# Altium footprint library MH_DA_THU_VIEN_16122016.PcbLib: 531 footprints (part 16 of 34)
Each footprint in its own frame and in the unit in brackets; x right, y up, seen from the top. Pads: shape width x height; smd on the part's side, far side on the other; paste and mask are expansions set on the pad; w line width, h text height; cw(c..) or ccw(c..) is an arc to the next point about the centre after c.
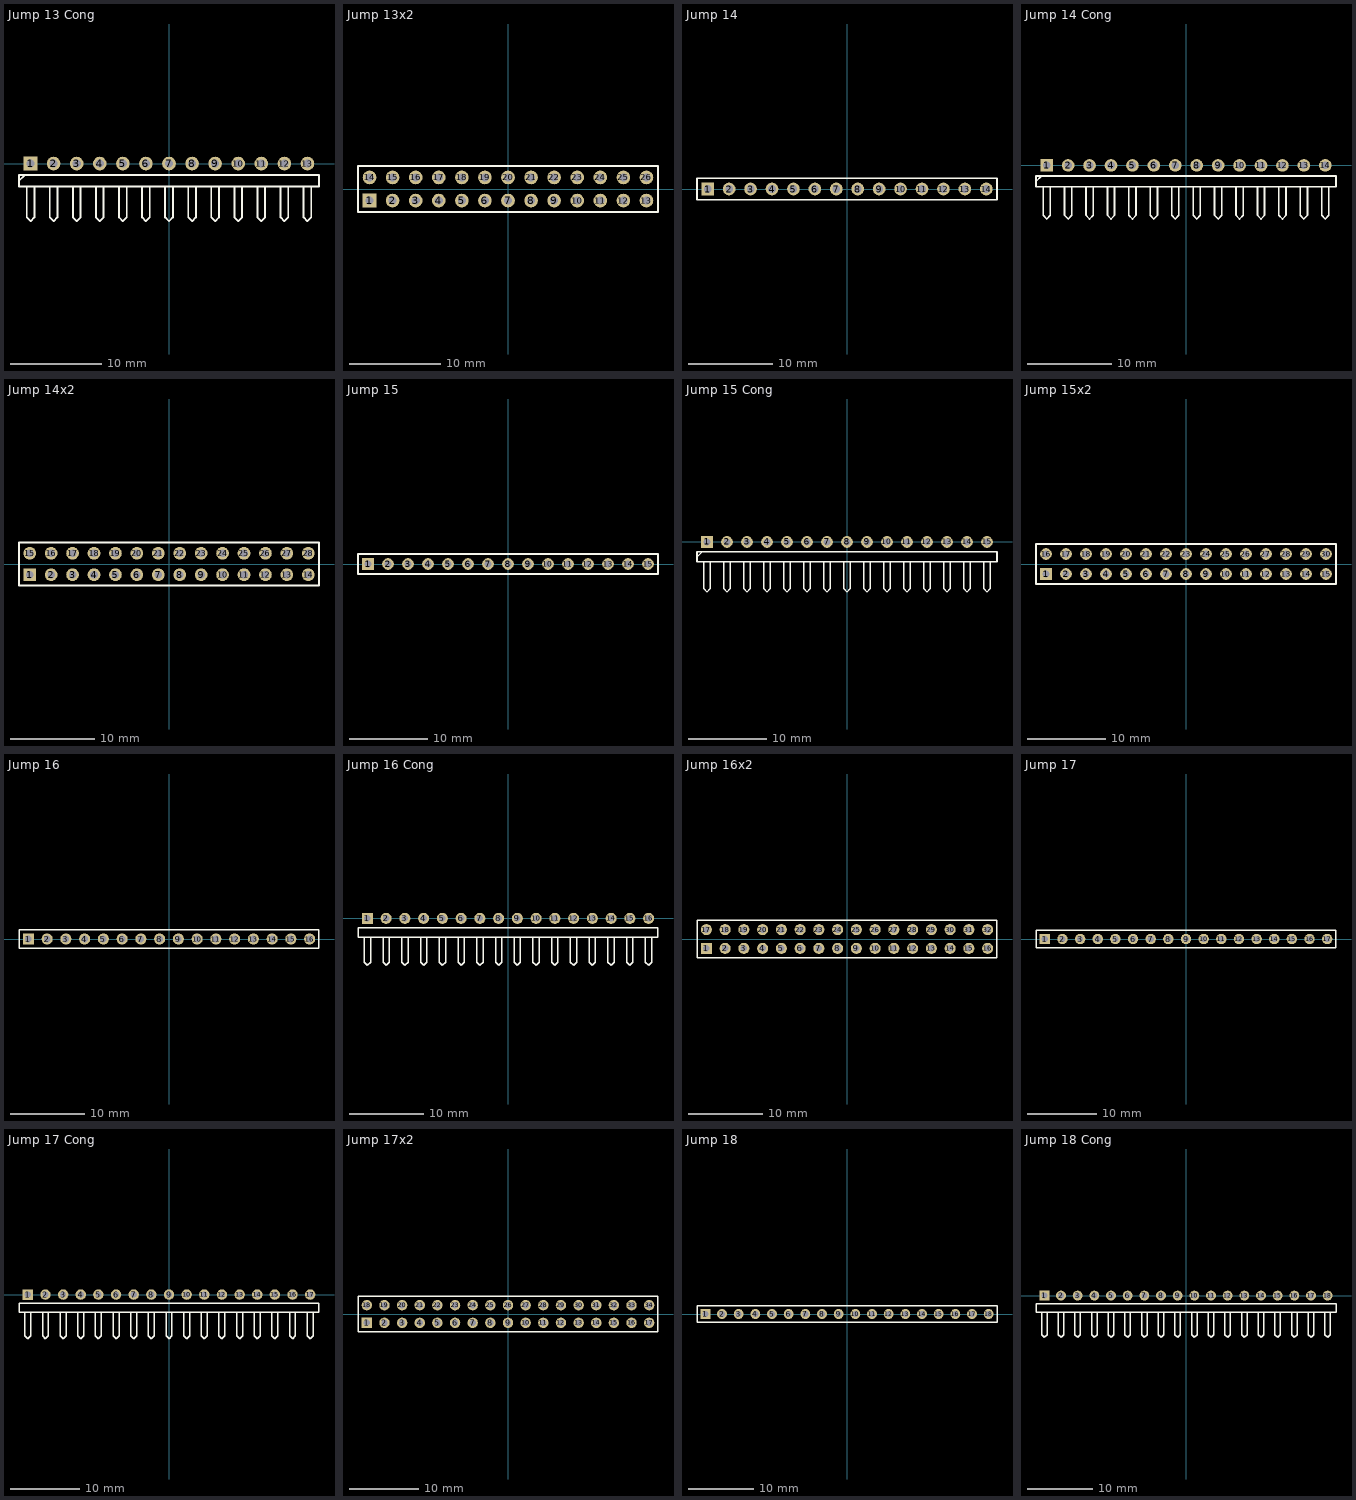
[diagram p15: the footprints below, top view; thin cyan lines are the x and y axes]

## Jump 13 Cong [mm]
pads (13):
  rect 1.5x1.5 hole 0.9: 1(-15.24,0)
  round 1.5 hole 0.9: 2(-12.7,0) 3(-10.16,0) 4(-7.62,0) 5(-5.08,0) 6(-2.54,0) 7(0,0) 8(2.54,0) 9(5.08,0) 10(7.62,0) 11(10.16,0) 12(12.7,0) 13(15.24,0)
Top Overlay:
  lines w0.2: -16.51,-1.905 -15.875,-1.27 ; -15.663,-2.54 -15.663,-5.927 -15.24,-6.35 -14.817,-5.927 -14.817,-2.54 ; -13.123,-2.54 -13.123,-5.927 -12.7,-6.35 -12.277,-5.927 -12.277,-2.54 ; -10.583,-2.54 -10.583,-5.927 -10.16,-6.35 -9.737,-5.927 -9.737,-2.54 ; -8.043,-2.54 -8.043,-5.927 -7.62,-6.35 -7.197,-5.927 -7.197,-2.54 ; -5.503,-2.54 -5.503,-5.927 -5.08,-6.35 -4.657,-5.927 -4.657,-2.54 ; -2.963,-2.54 -2.963,-5.927 -2.54,-6.35 -2.117,-5.927 -2.117,-2.54 ; -0.423,-2.54 -0.423,-5.927 0,-6.35 0.423,-5.927 0.423,-2.54 ; 2.117,-2.54 2.117,-5.927 2.54,-6.35 2.963,-5.927 2.963,-2.54 ; 4.657,-2.54 4.657,-5.927 5.08,-6.35 5.503,-5.927 5.503,-2.54 ; 7.197,-2.54 7.197,-5.927 7.62,-6.35 8.043,-5.927 8.043,-2.54 ; 9.737,-2.54 9.737,-5.927 10.16,-6.35 10.583,-5.927 10.583,-2.54 ; 12.277,-2.54 12.277,-5.927 12.7,-6.35 13.123,-5.927 13.123,-2.54 ; 14.817,-2.54 14.817,-5.927 15.24,-6.35 15.663,-5.927 15.663,-2.54 ; -16.51,-2.54 16.51,-2.54 16.51,-1.27 -14.605,-1.27 -16.51,-1.27 -16.51,-2.54
3D body: height 4.33, standoff -3, extent -16.51,-7 -11.43,1.27
3D body: height 4.33, standoff -3, extent -11.43,-7 -6.35,1.27
3D body: height 4.33, standoff -3, extent -6.35,-7 -1.27,1.27
3D body: height 4.33, standoff -3, extent -1.27,-7 3.81,1.27
3D body: height 4.33, standoff -3, extent 3.81,-7 8.89,1.27
3D body: height 4.33, standoff -3, extent 8.89,-7 16.51,1.27

## Jump 13x2 [mm]
pads (26):
  rect 1.5x1.5 hole 0.9: 1(-15.24,-1.27)
  round 1.5 hole 0.9: 2(-12.7,-1.27) 3(-10.16,-1.27) 4(-7.62,-1.27) 5(-5.08,-1.27) 6(-2.54,-1.27) 7(0,-1.27) 8(2.54,-1.27) 9(5.08,-1.27) 10(7.62,-1.27) 11(10.16,-1.27) 12(12.7,-1.27) 13(15.24,-1.27) 14(-15.24,1.27) 15(-12.7,1.27) 16(-10.16,1.27) 17(-7.62,1.27) 18(-5.08,1.27) 19(-2.54,1.27) 20(0,1.27) 21(2.54,1.27) 22(5.08,1.27) 23(7.62,1.27) 24(10.16,1.27) 25(12.7,1.27) 26(15.24,1.27)
Top Overlay:
  lines w0.2: -16.51,-2.54 -16.51,2.54 16.51,2.54 16.51,-2.54 -16.51,-2.54
3D body: height 1.5, standoff 0, extent -16.51,-2.54 -13.97,0
3D body: height 1.5, standoff 0, extent -16.51,0 -13.97,2.54
3D body: height 1.5, standoff 0, extent -13.97,-2.54 -11.43,0
3D body: height 1.5, standoff 0, extent -13.97,0 -11.43,2.54
3D body: height 1.5, standoff 0, extent -11.43,-2.54 -8.89,0
3D body: height 1.5, standoff 0, extent -11.43,0 -8.89,2.54
3D body: height 1.5, standoff 0, extent -8.89,-2.54 -6.35,0
3D body: height 1.5, standoff 0, extent -8.89,0 -6.35,2.54
3D body: height 1.5, standoff 0, extent -6.35,-2.54 -3.81,0
3D body: height 1.5, standoff 0, extent -6.35,0 -3.81,2.54
3D body: height 1.5, standoff 0, extent -3.81,-2.54 -1.27,0
3D body: height 1.5, standoff 0, extent -3.81,0 -1.27,2.54
3D body: height 1.5, standoff 0, extent -1.27,-2.54 1.27,0
3D body: height 1.5, standoff 0, extent -1.27,0 1.27,2.54
3D body: height 1.5, standoff 0, extent 1.27,-2.54 3.81,0
3D body: height 1.5, standoff 0, extent 1.27,0 3.81,2.54
3D body: height 1.5, standoff 0, extent 3.81,-2.54 6.35,0
3D body: height 1.5, standoff 0, extent 3.81,0 6.35,2.54
3D body: height 1.5, standoff 0, extent 6.35,-2.54 8.89,0
3D body: height 1.5, standoff 0, extent 6.35,0 8.89,2.54
3D body: height 1.5, standoff 0, extent 8.89,-2.54 11.43,0
3D body: height 1.5, standoff 0, extent 8.89,0 11.43,2.54
3D body: height 1.5, standoff 0, extent 13.97,0 16.51,2.54
3D body: height 1.5, standoff 0, extent 13.97,-2.54 16.51,0
3D body: height 1.5, standoff 0, extent 11.43,0 13.97,2.54
3D body: height 1.5, standoff 0, extent 11.43,-2.54 13.97,0

## Jump 14 [mm]
pads (14):
  rect 1.5x1.5 hole 0.9: 1(-16.51,0)
  round 1.5 hole 0.9: 2(-13.97,0) 3(-11.43,0) 4(-8.89,0) 5(-6.35,0) 6(-3.81,0) 7(-1.27,0) 8(1.27,0) 9(3.81,0) 10(6.35,0) 11(8.89,0) 12(11.43,0) 13(13.97,0) 14(16.51,0)
Top Overlay:
  lines w0.2: -17.78,-1.27 17.78,-1.27 17.78,1.27 -15.875,1.27 -17.78,1.27 -17.78,-1.27
3D body: height 1.5, standoff 0, extent -7.62,-1.27 -5.08,1.27
3D body: height 7, standoff -1, extent -6.756,-0.406 -5.96,0.392
3D body: height 1.5, standoff 0, extent -10.16,-1.27 -7.62,1.27
3D body: height 7, standoff -1, extent -9.296,-0.406 -8.5,0.392
3D body: height 1.5, standoff 0, extent -12.7,-1.27 -10.16,1.27
3D body: height 7, standoff -1, extent -11.836,-0.406 -11.04,0.392
3D body: height 1.5, standoff 0, extent -15.24,-1.27 -12.7,1.27
3D body: height 7, standoff -1, extent -14.376,-0.406 -13.58,0.392
3D body: height 1.5, standoff 0, extent -17.78,-1.27 -15.24,1.27
3D body: height 7, standoff -1, extent -16.916,-0.406 -16.12,0.392
3D body: height 1.5, standoff 0, extent 5.08,-1.27 7.62,1.27
3D body: height 7, standoff -1, extent 5.944,-0.406 6.74,0.392
3D body: height 1.5, standoff 0, extent 2.54,-1.27 5.08,1.27
3D body: height 7, standoff -1, extent 3.404,-0.406 4.2,0.392
3D body: height 1.5, standoff 0, extent 0,-1.27 2.54,1.27
3D body: height 7, standoff -1, extent 0.864,-0.406 1.66,0.392
3D body: height 1.5, standoff 0, extent -2.54,-1.27 0,1.27
3D body: height 7, standoff -1, extent -1.676,-0.406 -0.88,0.392
3D body: height 1.5, standoff 0, extent -5.08,-1.27 -2.54,1.27
3D body: height 7, standoff -1, extent -4.216,-0.406 -3.42,0.392
3D body: height 1.5, standoff 0, extent 15.24,-1.27 17.78,1.27
3D body: height 7, standoff -1, extent 16.104,-0.406 16.9,0.392
3D body: height 1.5, standoff 0, extent 12.7,-1.27 15.24,1.27
3D body: height 7, standoff -1, extent 13.564,-0.406 14.36,0.392
3D body: height 1.5, standoff 0, extent 10.16,-1.27 12.7,1.27
3D body: height 7, standoff -1, extent 11.024,-0.406 11.82,0.392
3D body: height 1.5, standoff 0, extent 7.62,-1.27 10.16,1.27
3D body: height 7, standoff -1, extent 8.484,-0.406 9.28,0.392

## Jump 14 Cong [mm]
pads (14):
  rect 1.5x1.5 hole 0.9: 1(-16.51,0)
  round 1.5 hole 0.9: 2(-13.97,0) 3(-11.43,0) 4(-8.89,0) 5(-6.35,0) 6(-3.81,0) 7(-1.27,0) 8(1.27,0) 9(3.81,0) 10(6.35,0) 11(8.89,0) 12(11.43,0) 13(13.97,0) 14(16.51,0)
Top Overlay:
  lines w0.2: -17.78,-1.905 -17.145,-1.27 ; -16.933,-2.54 -16.933,-5.927 -16.51,-6.35 -16.087,-5.927 -16.087,-2.54 ; -14.393,-2.54 -14.393,-5.927 -13.97,-6.35 -13.547,-5.927 -13.547,-2.54 ; -11.853,-2.54 -11.853,-5.927 -11.43,-6.35 -11.007,-5.927 -11.007,-2.54 ; -9.313,-2.54 -9.313,-5.927 -8.89,-6.35 -8.467,-5.927 -8.467,-2.54 ; -6.773,-2.54 -6.773,-5.927 -6.35,-6.35 -5.927,-5.927 -5.927,-2.54 ; -4.233,-2.54 -4.233,-5.927 -3.81,-6.35 -3.387,-5.927 -3.387,-2.54 ; -1.693,-2.54 -1.693,-5.927 -1.27,-6.35 -0.847,-5.927 -0.847,-2.54 ; 0.847,-2.54 0.847,-5.927 1.27,-6.35 1.693,-5.927 1.693,-2.54 ; 3.387,-2.54 3.387,-5.927 3.81,-6.35 4.233,-5.927 4.233,-2.54 ; 5.927,-2.54 5.927,-5.927 6.35,-6.35 6.773,-5.927 6.773,-2.54 ; 8.467,-2.54 8.467,-5.927 8.89,-6.35 9.313,-5.927 9.313,-2.54 ; 11.007,-2.54 11.007,-5.927 11.43,-6.35 11.853,-5.927 11.853,-2.54 ; 13.547,-2.54 13.547,-5.927 13.97,-6.35 14.393,-5.927 14.393,-2.54 ; 16.087,-2.54 16.087,-5.927 16.51,-6.35 16.933,-5.927 16.933,-2.54 ; -17.78,-2.54 -17.78,-1.27 -15.875,-1.27 17.78,-1.27 17.78,-2.54 -17.78,-2.54
3D body: height 4.33, standoff -3, extent 12.7,-7 17.78,1.27
3D body: height 4.33, standoff -3, extent 7.62,-7 12.7,1.27
3D body: height 4.33, standoff -3, extent 2.54,-7 7.62,1.27
3D body: height 4.33, standoff -3, extent -2.54,-7 2.54,1.27
3D body: height 4.33, standoff -3, extent -7.62,-7 -2.54,1.27
3D body: height 4.33, standoff -3, extent -12.7,-7 -7.62,1.27
3D body: height 4.33, standoff -3, extent -17.78,-7 -12.7,1.27

## Jump 14x2 [mm]
pads (28):
  rect 1.5x1.5 hole 0.9: 1(-16.51,-1.27)
  round 1.5 hole 0.9: 2(-13.97,-1.27) 3(-11.43,-1.27) 4(-8.89,-1.27) 5(-6.35,-1.27) 6(-3.81,-1.27) 7(-1.27,-1.27) 8(1.27,-1.27) 9(3.81,-1.27) 10(6.35,-1.27) 11(8.89,-1.27) 12(11.43,-1.27) 13(13.97,-1.27) 14(16.51,-1.27) 15(-16.51,1.27) 16(-13.97,1.27) 17(-11.43,1.27) 18(-8.89,1.27) 19(-6.35,1.27) 20(-3.81,1.27) 21(-1.27,1.27) 22(1.27,1.27) 23(3.81,1.27) 24(6.35,1.27) 25(8.89,1.27) 26(11.43,1.27) 27(13.97,1.27) 28(16.51,1.27)
Top Overlay:
  lines w0.2: -17.78,-2.54 17.78,-2.54 17.78,2.54 -17.78,2.54 -17.78,-2.54
3D body: height 1.5, standoff 0, extent 15.24,-2.54 17.78,0
3D body: height 1.5, standoff 0, extent 15.24,0 17.78,2.54
3D body: height 1.5, standoff 0, extent 10.16,-2.54 12.7,0
3D body: height 1.5, standoff 0, extent 10.16,0 12.7,2.54
3D body: height 1.5, standoff 0, extent 12.7,-2.54 15.24,0
3D body: height 1.5, standoff 0, extent 12.7,0 15.24,2.54
3D body: height 1.5, standoff 0, extent 7.62,0 10.16,2.54
3D body: height 1.5, standoff 0, extent 7.62,-2.54 10.16,0
3D body: height 1.5, standoff 0, extent 5.08,0 7.62,2.54
3D body: height 1.5, standoff 0, extent 5.08,-2.54 7.62,0
3D body: height 1.5, standoff 0, extent 2.54,0 5.08,2.54
3D body: height 1.5, standoff 0, extent 2.54,-2.54 5.08,0
3D body: height 1.5, standoff 0, extent 0,0 2.54,2.54
3D body: height 1.5, standoff 0, extent 0,-2.54 2.54,0
3D body: height 1.5, standoff 0, extent -2.54,0 0,2.54
3D body: height 1.5, standoff 0, extent -2.54,-2.54 0,0
3D body: height 1.5, standoff 0, extent -5.08,0 -2.54,2.54
3D body: height 1.5, standoff 0, extent -5.08,-2.54 -2.54,0
3D body: height 1.5, standoff 0, extent -7.62,0 -5.08,2.54
3D body: height 1.5, standoff 0, extent -7.62,-2.54 -5.08,0
3D body: height 1.5, standoff 0, extent -10.16,0 -7.62,2.54
3D body: height 1.5, standoff 0, extent -10.16,-2.54 -7.62,0
3D body: height 1.5, standoff 0, extent -12.7,0 -10.16,2.54
3D body: height 1.5, standoff 0, extent -12.7,-2.54 -10.16,0
3D body: height 1.5, standoff 0, extent -15.24,0 -12.7,2.54
3D body: height 1.5, standoff 0, extent -15.24,-2.54 -12.7,0
3D body: height 1.5, standoff 0, extent -17.78,0 -15.24,2.54
3D body: height 1.5, standoff 0, extent -17.78,-2.54 -15.24,0

## Jump 15 [mm]
pads (15):
  rect 1.5x1.5 hole 0.9: 1(-17.78,0)
  round 1.5 hole 0.9: 2(-15.24,0) 3(-12.7,0) 4(-10.16,0) 5(-7.62,0) 6(-5.08,0) 7(-2.54,0) 8(0,0) 9(2.54,0) 10(5.08,0) 11(7.62,0) 12(10.16,0) 13(12.7,0) 14(15.24,0) 15(17.78,0)
Top Overlay:
  lines w0.2: -19.05,-1.27 19.05,-1.27 19.05,1.27 -17.145,1.27 -19.05,1.27 -19.05,-1.27
3D body: height 7, standoff -1, extent 7.214,-0.406 8.01,0.392
3D body: height 1.5, standoff 0, extent 6.35,-1.27 8.89,1.27
3D body: height 7, standoff -1, extent 9.754,-0.406 10.55,0.392
3D body: height 1.5, standoff 0, extent 8.89,-1.27 11.43,1.27
3D body: height 7, standoff -1, extent 12.294,-0.406 13.09,0.392
3D body: height 1.5, standoff 0, extent 11.43,-1.27 13.97,1.27
3D body: height 7, standoff -1, extent 14.834,-0.406 15.63,0.392
3D body: height 1.5, standoff 0, extent 13.97,-1.27 16.51,1.27
3D body: height 7, standoff -1, extent 17.374,-0.406 18.17,0.392
3D body: height 1.5, standoff 0, extent 16.51,-1.27 19.05,1.27
3D body: height 7, standoff -1, extent -5.486,-0.406 -4.69,0.392
3D body: height 1.5, standoff 0, extent -6.35,-1.27 -3.81,1.27
3D body: height 7, standoff -1, extent -2.946,-0.406 -2.15,0.392
3D body: height 1.5, standoff 0, extent -3.81,-1.27 -1.27,1.27
3D body: height 7, standoff -1, extent -0.406,-0.406 0.39,0.392
3D body: height 1.5, standoff 0, extent -1.27,-1.27 1.27,1.27
3D body: height 7, standoff -1, extent 2.134,-0.406 2.93,0.392
3D body: height 1.5, standoff 0, extent 1.27,-1.27 3.81,1.27
3D body: height 7, standoff -1, extent 4.674,-0.406 5.47,0.392
3D body: height 1.5, standoff 0, extent 3.81,-1.27 6.35,1.27
3D body: height 7, standoff -1, extent -18.186,-0.406 -17.39,0.392
3D body: height 1.5, standoff 0, extent -19.05,-1.27 -16.51,1.27
3D body: height 7, standoff -1, extent -15.646,-0.406 -14.85,0.392
3D body: height 1.5, standoff 0, extent -16.51,-1.27 -13.97,1.27
3D body: height 7, standoff -1, extent -13.106,-0.406 -12.31,0.392
3D body: height 1.5, standoff 0, extent -13.97,-1.27 -11.43,1.27
3D body: height 7, standoff -1, extent -10.566,-0.406 -9.77,0.392
3D body: height 1.5, standoff 0, extent -11.43,-1.27 -8.89,1.27
3D body: height 7, standoff -1, extent -8.026,-0.406 -7.23,0.392
3D body: height 1.5, standoff 0, extent -8.89,-1.27 -6.35,1.27

## Jump 15 Cong [mm]
pads (15):
  rect 1.5x1.5 hole 0.9: 1(-17.78,0)
  round 1.5 hole 0.9: 2(-15.24,0) 3(-12.7,0) 4(-10.16,0) 5(-7.62,0) 6(-5.08,0) 7(-2.54,0) 8(0,0) 9(2.54,0) 10(5.08,0) 11(7.62,0) 12(10.16,0) 13(12.7,0) 14(15.24,0) 15(17.78,0)
Top Overlay:
  lines w0.2: -19.05,-1.905 -18.415,-1.27 ; -18.203,-2.54 -18.203,-5.927 -17.78,-6.35 -17.357,-5.927 -17.357,-2.54 ; -15.663,-2.54 -15.663,-5.927 -15.24,-6.35 -14.817,-5.927 -14.817,-2.54 ; -13.123,-2.54 -13.123,-5.927 -12.7,-6.35 -12.277,-5.927 -12.277,-2.54 ; -10.583,-2.54 -10.583,-5.927 -10.16,-6.35 -9.737,-5.927 -9.737,-2.54 ; -8.043,-2.54 -8.043,-5.927 -7.62,-6.35 -7.197,-5.927 -7.197,-2.54 ; -5.503,-2.54 -5.503,-5.927 -5.08,-6.35 -4.657,-5.927 -4.657,-2.54 ; -2.963,-2.54 -2.963,-5.927 -2.54,-6.35 -2.117,-5.927 -2.117,-2.54 ; -0.423,-2.54 -0.423,-5.927 0,-6.35 0.423,-5.927 0.423,-2.54 ; 2.117,-2.54 2.117,-5.927 2.54,-6.35 2.963,-5.927 2.963,-2.54 ; 4.657,-2.54 4.657,-5.927 5.08,-6.35 5.503,-5.927 5.503,-2.54 ; 7.197,-2.54 7.197,-5.927 7.62,-6.35 8.043,-5.927 8.043,-2.54 ; 9.737,-2.54 9.737,-5.927 10.16,-6.35 10.583,-5.927 10.583,-2.54 ; 12.277,-2.54 12.277,-5.927 12.7,-6.35 13.123,-5.927 13.123,-2.54 ; 14.817,-2.54 14.817,-5.927 15.24,-6.35 15.663,-5.927 15.663,-2.54 ; 17.357,-2.54 17.357,-5.927 17.78,-6.35 18.203,-5.927 18.203,-2.54 ; -19.05,-2.54 -19.05,-1.27 -17.145,-1.27 19.05,-1.27 19.05,-2.54 -19.05,-2.54
3D body: height 4.33, standoff -3, extent 1.27,-7 6.35,1.27
3D body: height 4.33, standoff -3, extent -3.81,-7 1.27,1.27
3D body: height 4.33, standoff -3, extent -8.89,-7 -3.81,1.27
3D body: height 4.33, standoff -3, extent -13.97,-7 -8.89,1.27
3D body: height 4.33, standoff -3, extent -19.05,-7 -13.97,1.27
3D body: height 4.33, standoff -3, extent 6.35,-7 13.97,1.27
3D body: height 4.33, standoff -3, extent 13.97,-7 19.05,1.27

## Jump 15x2 [mm]
pads (30):
  rect 1.5x1.5 hole 0.9: 1(-17.78,-1.27)
  round 1.5 hole 0.9: 2(-15.24,-1.27) 3(-12.7,-1.27) 4(-10.16,-1.27) 5(-7.62,-1.27) 6(-5.08,-1.27) 7(-2.54,-1.27) 8(0,-1.27) 9(2.54,-1.27) 10(5.08,-1.27) 11(7.62,-1.27) 12(10.16,-1.27) 13(12.7,-1.27) 14(15.24,-1.27) 15(17.78,-1.27) 16(-17.78,1.27) 17(-15.24,1.27) 18(-12.7,1.27) 19(-10.16,1.27) 20(-7.62,1.27) 21(-5.08,1.27) 22(-2.54,1.27) 23(0,1.27) 24(2.54,1.27) 25(5.08,1.27) 26(7.62,1.27) 27(10.16,1.27) 28(12.7,1.27) 29(15.24,1.27) 30(17.78,1.27)
Top Overlay:
  lines w0.2: -19.05,-2.54 19.05,-2.54 19.05,2.54 -19.05,2.54 -19.05,-2.54
3D body: height 1.5, standoff 0, extent -19.05,-2.54 -16.51,0
3D body: height 1.5, standoff 0, extent -19.05,0 -16.51,2.54
3D body: height 1.5, standoff 0, extent -16.51,-2.54 -13.97,0
3D body: height 1.5, standoff 0, extent -16.51,0 -13.97,2.54
3D body: height 1.5, standoff 0, extent -13.97,-2.54 -11.43,0
3D body: height 1.5, standoff 0, extent -13.97,0 -11.43,2.54
3D body: height 1.5, standoff 0, extent -11.43,-2.54 -8.89,0
3D body: height 1.5, standoff 0, extent -11.43,0 -8.89,2.54
3D body: height 1.5, standoff 0, extent -8.89,-2.54 -6.35,0
3D body: height 1.5, standoff 0, extent -8.89,0 -6.35,2.54
3D body: height 1.5, standoff 0, extent -6.35,-2.54 -3.81,0
3D body: height 1.5, standoff 0, extent -6.35,0 -3.81,2.54
3D body: height 1.5, standoff 0, extent -3.81,-2.54 -1.27,0
3D body: height 1.5, standoff 0, extent -3.81,0 -1.27,2.54
3D body: height 1.5, standoff 0, extent -1.27,-2.54 1.27,0
3D body: height 1.5, standoff 0, extent -1.27,0 1.27,2.54
3D body: height 1.5, standoff 0, extent 1.27,-2.54 3.81,0
3D body: height 1.5, standoff 0, extent 1.27,0 3.81,2.54
3D body: height 1.5, standoff 0, extent 3.81,-2.54 6.35,0
3D body: height 1.5, standoff 0, extent 3.81,0 6.35,2.54
3D body: height 1.5, standoff 0, extent 6.35,-2.54 8.89,0
3D body: height 1.5, standoff 0, extent 6.35,0 8.89,2.54
3D body: height 1.5, standoff 0, extent 11.43,0 13.97,2.54
3D body: height 1.5, standoff 0, extent 11.43,-2.54 13.97,0
3D body: height 1.5, standoff 0, extent 8.89,0 11.43,2.54
3D body: height 1.5, standoff 0, extent 8.89,-2.54 11.43,0
3D body: height 1.5, standoff 0, extent 16.51,0 19.05,2.54
3D body: height 1.5, standoff 0, extent 16.51,-2.54 19.05,0
3D body: height 1.5, standoff 0, extent 13.97,0 16.51,2.54
3D body: height 1.5, standoff 0, extent 13.97,-2.54 16.51,0

## Jump 16 [mm]
pads (16):
  rect 1.5x1.5 hole 0.9: 1(-19.05,0)
  round 1.5 hole 0.9: 2(-16.51,0) 3(-13.97,0) 4(-11.43,0) 5(-8.89,0) 6(-6.35,0) 7(-3.81,0) 8(-1.27,0) 9(1.27,0) 10(3.81,0) 11(6.35,0) 12(8.89,0) 13(11.43,0) 14(13.97,0) 15(16.51,0) 16(19.05,0)
Top Overlay:
  lines w0.2: -20.32,-1.27 -20.32,1.27 -18.415,1.27 20.32,1.27 20.32,-1.27 -20.32,-1.27
3D body: height 1.5, standoff 0, extent -10.16,-1.27 -7.62,1.27
3D body: height 7, standoff -1, extent -9.296,-0.406 -8.5,0.392
3D body: height 1.5, standoff 0, extent -12.7,-1.27 -10.16,1.27
3D body: height 7, standoff -1, extent -11.836,-0.406 -11.04,0.392
3D body: height 1.5, standoff 0, extent -15.24,-1.27 -12.7,1.27
3D body: height 7, standoff -1, extent -14.376,-0.406 -13.58,0.392
3D body: height 1.5, standoff 0, extent -17.78,-1.27 -15.24,1.27
3D body: height 7, standoff -1, extent -16.916,-0.406 -16.12,0.392
3D body: height 1.5, standoff 0, extent -20.32,-1.27 -17.78,1.27
3D body: height 7, standoff -1, extent -19.456,-0.406 -18.66,0.392
3D body: height 1.5, standoff 0, extent 2.54,-1.27 5.08,1.27
3D body: height 7, standoff -1, extent 3.404,-0.406 4.2,0.392
3D body: height 1.5, standoff 0, extent 0,-1.27 2.54,1.27
3D body: height 7, standoff -1, extent 0.864,-0.406 1.66,0.392
3D body: height 1.5, standoff 0, extent -2.54,-1.27 0,1.27
3D body: height 7, standoff -1, extent -1.676,-0.406 -0.88,0.392
3D body: height 1.5, standoff 0, extent -5.08,-1.27 -2.54,1.27
3D body: height 7, standoff -1, extent -4.216,-0.406 -3.42,0.392
3D body: height 1.5, standoff 0, extent -7.62,-1.27 -5.08,1.27
3D body: height 7, standoff -1, extent -6.756,-0.406 -5.96,0.392
3D body: height 1.5, standoff 0, extent 15.24,-1.27 17.78,1.27
3D body: height 7, standoff -1, extent 16.104,-0.406 16.9,0.392
3D body: height 1.5, standoff 0, extent 12.7,-1.27 15.24,1.27
3D body: height 7, standoff -1, extent 13.564,-0.406 14.36,0.392
3D body: height 1.5, standoff 0, extent 10.16,-1.27 12.7,1.27
3D body: height 7, standoff -1, extent 11.024,-0.406 11.82,0.392
3D body: height 1.5, standoff 0, extent 7.62,-1.27 10.16,1.27
3D body: height 7, standoff -1, extent 8.484,-0.406 9.28,0.392
3D body: height 1.5, standoff 0, extent 5.08,-1.27 7.62,1.27
3D body: height 7, standoff -1, extent 5.944,-0.406 6.74,0.392
3D body: height 1.5, standoff 0, extent 17.78,-1.27 20.32,1.27
3D body: height 7, standoff -1, extent 18.644,-0.406 19.44,0.392

## Jump 16 Cong [mm]
pads (16):
  rect 1.5x1.5 hole 0.9: 1(-19.05,0)
  round 1.5 hole 0.9: 2(-16.51,0) 3(-13.97,0) 4(-11.43,0) 5(-8.89,0) 6(-6.35,0) 7(-3.81,0) 8(-1.27,0) 9(1.27,0) 10(3.81,0) 11(6.35,0) 12(8.89,0) 13(11.43,0) 14(13.97,0) 15(16.51,0) 16(19.05,0)
Top Overlay:
  lines w0.2: -19.473,-2.54 -19.473,-5.927 -19.05,-6.35 -18.627,-5.927 -18.627,-2.54 ; -16.933,-2.54 -16.933,-5.927 -16.51,-6.35 -16.087,-5.927 -16.087,-2.54 ; -14.393,-2.54 -14.393,-5.927 -13.97,-6.35 -13.547,-5.927 -13.547,-2.54 ; -11.853,-2.54 -11.853,-5.927 -11.43,-6.35 -11.007,-5.927 -11.007,-2.54 ; -9.313,-2.54 -9.313,-5.927 -8.89,-6.35 -8.467,-5.927 -8.467,-2.54 ; -6.773,-2.54 -6.773,-5.927 -6.35,-6.35 -5.927,-5.927 -5.927,-2.54 ; -4.233,-2.54 -4.233,-5.927 -3.81,-6.35 -3.387,-5.927 -3.387,-2.54 ; -1.693,-2.54 -1.693,-5.927 -1.27,-6.35 -0.847,-5.927 -0.847,-2.54 ; 0.847,-2.54 0.847,-5.927 1.27,-6.35 1.693,-5.927 1.693,-2.54 ; 3.387,-2.54 3.387,-5.927 3.81,-6.35 4.233,-5.927 4.233,-2.54 ; 5.927,-2.54 5.927,-5.927 6.35,-6.35 6.773,-5.927 6.773,-2.54 ; 8.467,-2.54 8.467,-5.927 8.89,-6.35 9.313,-5.927 9.313,-2.54 ; 11.007,-2.54 11.007,-5.927 11.43,-6.35 11.853,-5.927 11.853,-2.54 ; 13.547,-2.54 13.547,-5.927 13.97,-6.35 14.393,-5.927 14.393,-2.54 ; 16.087,-2.54 16.087,-5.927 16.51,-6.35 16.933,-5.927 16.933,-2.54 ; 18.627,-2.54 18.627,-5.927 19.05,-6.35 19.473,-5.927 19.473,-2.54 ; -20.32,-2.54 20.32,-2.54 20.32,-1.27 -18.415,-1.27 -20.32,-1.27 -20.32,-2.54
3D body: height 4.33, standoff -3, extent 15.24,-7 20.32,1.27
3D body: height 4.33, standoff -3, extent 10.16,-7 15.24,1.27
3D body: height 4.33, standoff -3, extent 5.08,-7 10.16,1.27
3D body: height 4.33, standoff -3, extent 0,-7 5.08,1.27
3D body: height 4.33, standoff -3, extent -5.08,-7 0,1.27
3D body: height 4.33, standoff -3, extent -10.16,-7 -5.08,1.27
3D body: height 4.33, standoff -3, extent -15.24,-7 -10.16,1.27
3D body: height 4.33, standoff -3, extent -20.32,-7 -15.24,1.27

## Jump 16x2 [mm]
pads (32):
  rect 1.5x1.5 hole 0.9: 1(-19.05,-1.27)
  round 1.5 hole 0.9: 2(-16.51,-1.27) 3(-13.97,-1.27) 4(-11.43,-1.27) 5(-8.89,-1.27) 6(-6.35,-1.27) 7(-3.81,-1.27) 8(-1.27,-1.27) 9(1.27,-1.27) 10(3.81,-1.27) 11(6.35,-1.27) 12(8.89,-1.27) 13(11.43,-1.27) 14(13.97,-1.27) 15(16.51,-1.27) 16(19.05,-1.27) 17(-19.05,1.27) 18(-16.51,1.27) 19(-13.97,1.27) 20(-11.43,1.27) 21(-8.89,1.27) 22(-6.35,1.27) 23(-3.81,1.27) 24(-1.27,1.27) 25(1.27,1.27) 26(3.81,1.27) 27(6.35,1.27) 28(8.89,1.27) 29(11.43,1.27) 30(13.97,1.27) 31(16.51,1.27) 32(19.05,1.27)
Top Overlay:
  lines w0.2: -20.32,-2.54 -20.32,2.54 20.32,2.54 20.32,-2.54 -20.32,-2.54
3D body: height 1.5, standoff 0, extent -20.32,-2.54 -17.78,0
3D body: height 1.5, standoff 0, extent -20.32,0 -17.78,2.54
3D body: height 1.5, standoff 0, extent -17.78,-2.54 -15.24,0
3D body: height 1.5, standoff 0, extent -17.78,0 -15.24,2.54
3D body: height 1.5, standoff 0, extent -15.24,-2.54 -12.7,0
3D body: height 1.5, standoff 0, extent -15.24,0 -12.7,2.54
3D body: height 1.5, standoff 0, extent -12.7,-2.54 -10.16,0
3D body: height 1.5, standoff 0, extent -12.7,0 -10.16,2.54
3D body: height 1.5, standoff 0, extent -10.16,-2.54 -7.62,0
3D body: height 1.5, standoff 0, extent -10.16,0 -7.62,2.54
3D body: height 1.5, standoff 0, extent -7.62,-2.54 -5.08,0
3D body: height 1.5, standoff 0, extent -7.62,0 -5.08,2.54
3D body: height 1.5, standoff 0, extent -5.08,-2.54 -2.54,0
3D body: height 1.5, standoff 0, extent -5.08,0 -2.54,2.54
3D body: height 1.5, standoff 0, extent -2.54,-2.54 0,0
3D body: height 1.5, standoff 0, extent -2.54,0 0,2.54
3D body: height 1.5, standoff 0, extent 0,-2.54 2.54,0
3D body: height 1.5, standoff 0, extent 0,0 2.54,2.54
3D body: height 1.5, standoff 0, extent 2.54,-2.54 5.08,0
3D body: height 1.5, standoff 0, extent 2.54,0 5.08,2.54
3D body: height 1.5, standoff 0, extent 5.08,-2.54 7.62,0
3D body: height 1.5, standoff 0, extent 5.08,0 7.62,2.54
3D body: height 1.5, standoff 0, extent 10.16,0 12.7,2.54
3D body: height 1.5, standoff 0, extent 10.16,-2.54 12.7,0
3D body: height 1.5, standoff 0, extent 7.62,0 10.16,2.54
3D body: height 1.5, standoff 0, extent 7.62,-2.54 10.16,0
3D body: height 1.5, standoff 0, extent 15.24,0 17.78,2.54
3D body: height 1.5, standoff 0, extent 15.24,-2.54 17.78,0
3D body: height 1.5, standoff 0, extent 12.7,0 15.24,2.54
3D body: height 1.5, standoff 0, extent 12.7,-2.54 15.24,0
3D body: height 1.5, standoff 0, extent 17.78,0 20.32,2.54
3D body: height 1.5, standoff 0, extent 17.78,-2.54 20.32,0

## Jump 17 [mm]
pads (17):
  rect 1.5x1.5 hole 0.9: 1(-20.32,0)
  round 1.5 hole 0.9: 2(-17.78,0) 3(-15.24,0) 4(-12.7,0) 5(-10.16,0) 6(-7.62,0) 7(-5.08,0) 8(-2.54,0) 9(0,0) 10(2.54,0) 11(5.08,0) 12(7.62,0) 13(10.16,0) 14(12.7,0) 15(15.24,0) 16(17.78,0) 17(20.32,0)
Top Overlay:
  lines w0.2: -21.59,-1.27 21.59,-1.27 21.59,1.27 -19.685,1.27 -21.59,1.27 -21.59,-1.27
3D body: height 1.5, standoff 0, extent -11.43,-1.27 -8.89,1.27
3D body: height 7, standoff -1, extent -10.566,-0.406 -9.77,0.392
3D body: height 1.5, standoff 0, extent -13.97,-1.27 -11.43,1.27
3D body: height 7, standoff -1, extent -13.106,-0.406 -12.31,0.392
3D body: height 1.5, standoff 0, extent -16.51,-1.27 -13.97,1.27
3D body: height 7, standoff -1, extent -15.646,-0.406 -14.85,0.392
3D body: height 1.5, standoff 0, extent -19.05,-1.27 -16.51,1.27
3D body: height 7, standoff -1, extent -18.186,-0.406 -17.39,0.392
3D body: height 1.5, standoff 0, extent -21.59,-1.27 -19.05,1.27
3D body: height 7, standoff -1, extent -20.726,-0.406 -19.93,0.392
3D body: height 1.5, standoff 0, extent 1.27,-1.27 3.81,1.27
3D body: height 7, standoff -1, extent 2.134,-0.406 2.93,0.392
3D body: height 1.5, standoff 0, extent -1.27,-1.27 1.27,1.27
3D body: height 7, standoff -1, extent -0.406,-0.406 0.39,0.392
3D body: height 1.5, standoff 0, extent -3.81,-1.27 -1.27,1.27
3D body: height 7, standoff -1, extent -2.946,-0.406 -2.15,0.392
3D body: height 1.5, standoff 0, extent -6.35,-1.27 -3.81,1.27
3D body: height 7, standoff -1, extent -5.486,-0.406 -4.69,0.392
3D body: height 1.5, standoff 0, extent -8.89,-1.27 -6.35,1.27
3D body: height 7, standoff -1, extent -8.026,-0.406 -7.23,0.392
3D body: height 1.5, standoff 0, extent 13.97,-1.27 16.51,1.27
3D body: height 7, standoff -1, extent 14.834,-0.406 15.63,0.392
3D body: height 1.5, standoff 0, extent 11.43,-1.27 13.97,1.27
3D body: height 7, standoff -1, extent 12.294,-0.406 13.09,0.392
3D body: height 1.5, standoff 0, extent 8.89,-1.27 11.43,1.27
3D body: height 7, standoff -1, extent 9.754,-0.406 10.55,0.392
3D body: height 1.5, standoff 0, extent 6.35,-1.27 8.89,1.27
3D body: height 7, standoff -1, extent 7.214,-0.406 8.01,0.392
3D body: height 1.5, standoff 0, extent 3.81,-1.27 6.35,1.27
3D body: height 7, standoff -1, extent 4.674,-0.406 5.47,0.392
3D body: height 1.5, standoff 0, extent 19.05,-1.27 21.59,1.27
3D body: height 7, standoff -1, extent 19.914,-0.406 20.71,0.392
3D body: height 1.5, standoff 0, extent 16.51,-1.27 19.05,1.27
3D body: height 7, standoff -1, extent 17.374,-0.406 18.17,0.392

## Jump 17 Cong [mm]
pads (17):
  rect 1.5x1.5 hole 0.9: 1(-20.32,0)
  round 1.5 hole 0.9: 2(-17.78,0) 3(-15.24,0) 4(-12.7,0) 5(-10.16,0) 6(-7.62,0) 7(-5.08,0) 8(-2.54,0) 9(0,0) 10(2.54,0) 11(5.08,0) 12(7.62,0) 13(10.16,0) 14(12.7,0) 15(15.24,0) 16(17.78,0) 17(20.32,0)
Top Overlay:
  lines w0.2: -20.743,-2.54 -20.743,-5.927 -20.32,-6.35 -19.897,-5.927 -19.897,-2.54 ; -18.203,-2.54 -18.203,-5.927 -17.78,-6.35 -17.357,-5.927 -17.357,-2.54 ; -15.663,-2.54 -15.663,-5.927 -15.24,-6.35 -14.817,-5.927 -14.817,-2.54 ; -13.123,-2.54 -13.123,-5.927 -12.7,-6.35 -12.277,-5.927 -12.277,-2.54 ; -10.583,-2.54 -10.583,-5.927 -10.16,-6.35 -9.737,-5.927 -9.737,-2.54 ; -8.043,-2.54 -8.043,-5.927 -7.62,-6.35 -7.197,-5.927 -7.197,-2.54 ; -5.503,-2.54 -5.503,-5.927 -5.08,-6.35 -4.657,-5.927 -4.657,-2.54 ; -2.963,-2.54 -2.963,-5.927 -2.54,-6.35 -2.117,-5.927 -2.117,-2.54 ; -0.423,-2.54 -0.423,-5.927 0,-6.35 0.423,-5.927 0.423,-2.54 ; 2.117,-2.54 2.117,-5.927 2.54,-6.35 2.963,-5.927 2.963,-2.54 ; 4.657,-2.54 4.657,-5.927 5.08,-6.35 5.503,-5.927 5.503,-2.54 ; 7.197,-2.54 7.197,-5.927 7.62,-6.35 8.043,-5.927 8.043,-2.54 ; 9.737,-2.54 9.737,-5.927 10.16,-6.35 10.583,-5.927 10.583,-2.54 ; 12.277,-2.54 12.277,-5.927 12.7,-6.35 13.123,-5.927 13.123,-2.54 ; 14.817,-2.54 14.817,-5.927 15.24,-6.35 15.663,-5.927 15.663,-2.54 ; 17.357,-2.54 17.357,-5.927 17.78,-6.35 18.203,-5.927 18.203,-2.54 ; 19.897,-2.54 19.897,-5.927 20.32,-6.35 20.743,-5.927 20.743,-2.54 ; -21.59,-2.54 21.59,-2.54 21.59,-1.27 -19.685,-1.27 -21.59,-1.27 -21.59,-2.54
3D body: height 4.33, standoff -3, extent 13.97,-7 21.59,1.27
3D body: height 4.33, standoff -3, extent -21.59,-7 -16.51,1.27
3D body: height 4.33, standoff -3, extent -16.51,-7 -11.43,1.27
3D body: height 4.33, standoff -3, extent -11.43,-7 -6.35,1.27
3D body: height 4.33, standoff -3, extent -6.35,-7 -1.27,1.27
3D body: height 4.33, standoff -3, extent -1.27,-7 3.81,1.27
3D body: height 4.33, standoff -3, extent 3.81,-7 8.89,1.27
3D body: height 4.33, standoff -3, extent 8.89,-7 13.97,1.27

## Jump 17x2 [mm]
pads (34):
  rect 1.5x1.5 hole 0.9: 1(-20.32,-1.27)
  round 1.5 hole 0.9: 2(-17.78,-1.27) 3(-15.24,-1.27) 4(-12.7,-1.27) 5(-10.16,-1.27) 6(-7.62,-1.27) 7(-5.08,-1.27) 8(-2.54,-1.27) 9(0,-1.27) 10(2.54,-1.27) 11(5.08,-1.27) 12(7.62,-1.27) 13(10.16,-1.27) 14(12.7,-1.27) 15(15.24,-1.27) 16(17.78,-1.27) 17(20.32,-1.27) 18(-20.32,1.27) 19(-17.78,1.27) 20(-15.24,1.27) 21(-12.7,1.27) 22(-10.16,1.27) 23(-7.62,1.27) 24(-5.08,1.27) 25(-2.54,1.27) 26(0,1.27) 27(2.54,1.27) 28(5.08,1.27) 29(7.62,1.27) 30(10.16,1.27) 31(12.7,1.27) 32(15.24,1.27) 33(17.78,1.27) 34(20.32,1.27)
Top Overlay:
  lines w0.2: -21.59,-2.54 -21.59,2.54 21.59,2.54 21.59,-2.54 -21.59,-2.54
3D body: height 1.5, standoff 0, extent 16.51,-2.54 19.05,0
3D body: height 1.5, standoff 0, extent 16.51,0 19.05,2.54
3D body: height 1.5, standoff 0, extent 19.05,-2.54 21.59,0
3D body: height 1.5, standoff 0, extent 19.05,0 21.59,2.54
3D body: height 1.5, standoff 0, extent 11.43,-2.54 13.97,0
3D body: height 1.5, standoff 0, extent 11.43,0 13.97,2.54
3D body: height 1.5, standoff 0, extent 13.97,-2.54 16.51,0
3D body: height 1.5, standoff 0, extent 13.97,0 16.51,2.54
3D body: height 1.5, standoff 0, extent 6.35,-2.54 8.89,0
3D body: height 1.5, standoff 0, extent 6.35,0 8.89,2.54
3D body: height 1.5, standoff 0, extent 8.89,-2.54 11.43,0
3D body: height 1.5, standoff 0, extent 8.89,0 11.43,2.54
3D body: height 1.5, standoff 0, extent 3.81,0 6.35,2.54
3D body: height 1.5, standoff 0, extent 3.81,-2.54 6.35,0
3D body: height 1.5, standoff 0, extent 1.27,0 3.81,2.54
3D body: height 1.5, standoff 0, extent 1.27,-2.54 3.81,0
3D body: height 1.5, standoff 0, extent -1.27,0 1.27,2.54
3D body: height 1.5, standoff 0, extent -1.27,-2.54 1.27,0
3D body: height 1.5, standoff 0, extent -3.81,0 -1.27,2.54
3D body: height 1.5, standoff 0, extent -3.81,-2.54 -1.27,0
3D body: height 1.5, standoff 0, extent -6.35,0 -3.81,2.54
3D body: height 1.5, standoff 0, extent -6.35,-2.54 -3.81,0
3D body: height 1.5, standoff 0, extent -8.89,0 -6.35,2.54
3D body: height 1.5, standoff 0, extent -8.89,-2.54 -6.35,0
3D body: height 1.5, standoff 0, extent -11.43,0 -8.89,2.54
3D body: height 1.5, standoff 0, extent -11.43,-2.54 -8.89,0
3D body: height 1.5, standoff 0, extent -13.97,0 -11.43,2.54
3D body: height 1.5, standoff 0, extent -13.97,-2.54 -11.43,0
3D body: height 1.5, standoff 0, extent -16.51,0 -13.97,2.54
3D body: height 1.5, standoff 0, extent -16.51,-2.54 -13.97,0
3D body: height 1.5, standoff 0, extent -19.05,0 -16.51,2.54
3D body: height 1.5, standoff 0, extent -19.05,-2.54 -16.51,0
3D body: height 1.5, standoff 0, extent -21.59,0 -19.05,2.54
3D body: height 1.5, standoff 0, extent -21.59,-2.54 -19.05,0

## Jump 18 [mm]
pads (18):
  rect 1.5x1.5 hole 0.9: 1(-21.59,0)
  round 1.5 hole 0.9: 2(-19.05,0) 3(-16.51,0) 4(-13.97,0) 5(-11.43,0) 6(-8.89,0) 7(-6.35,0) 8(-3.81,0) 9(-1.27,0) 10(1.27,0) 11(3.81,0) 12(6.35,0) 13(8.89,0) 14(11.43,0) 15(13.97,0) 16(16.51,0) 17(19.05,0) 18(21.59,0)
Top Overlay:
  lines w0.2: -22.86,-1.27 22.86,-1.27 22.86,1.27 -20.955,1.27 -22.86,1.27 -22.86,-1.27
3D body: height 1.5, standoff 0, extent -12.7,-1.27 -10.16,1.27
3D body: height 7, standoff -1, extent -11.836,-0.406 -11.04,0.392
3D body: height 1.5, standoff 0, extent -15.24,-1.27 -12.7,1.27
3D body: height 7, standoff -1, extent -14.376,-0.406 -13.58,0.392
3D body: height 1.5, standoff 0, extent -17.78,-1.27 -15.24,1.27
3D body: height 7, standoff -1, extent -16.916,-0.406 -16.12,0.392
3D body: height 1.5, standoff 0, extent -20.32,-1.27 -17.78,1.27
3D body: height 7, standoff -1, extent -19.456,-0.406 -18.66,0.392
3D body: height 1.5, standoff 0, extent -22.86,-1.27 -20.32,1.27
3D body: height 7, standoff -1, extent -21.996,-0.406 -21.2,0.392
3D body: height 1.5, standoff 0, extent 0,-1.27 2.54,1.27
3D body: height 7, standoff -1, extent 0.864,-0.406 1.66,0.392
3D body: height 1.5, standoff 0, extent -2.54,-1.27 0,1.27
3D body: height 7, standoff -1, extent -1.676,-0.406 -0.88,0.392
3D body: height 1.5, standoff 0, extent -5.08,-1.27 -2.54,1.27
3D body: height 7, standoff -1, extent -4.216,-0.406 -3.42,0.392
3D body: height 1.5, standoff 0, extent -7.62,-1.27 -5.08,1.27
3D body: height 7, standoff -1, extent -6.756,-0.406 -5.96,0.392
3D body: height 1.5, standoff 0, extent -10.16,-1.27 -7.62,1.27
3D body: height 7, standoff -1, extent -9.296,-0.406 -8.5,0.392
3D body: height 1.5, standoff 0, extent 12.7,-1.27 15.24,1.27
3D body: height 7, standoff -1, extent 13.564,-0.406 14.36,0.392
3D body: height 1.5, standoff 0, extent 10.16,-1.27 12.7,1.27
3D body: height 7, standoff -1, extent 11.024,-0.406 11.82,0.392
3D body: height 1.5, standoff 0, extent 7.62,-1.27 10.16,1.27
3D body: height 7, standoff -1, extent 8.484,-0.406 9.28,0.392
3D body: height 1.5, standoff 0, extent 5.08,-1.27 7.62,1.27
3D body: height 7, standoff -1, extent 5.944,-0.406 6.74,0.392
3D body: height 1.5, standoff 0, extent 2.54,-1.27 5.08,1.27
3D body: height 7, standoff -1, extent 3.404,-0.406 4.2,0.392
3D body: height 1.5, standoff 0, extent 20.32,-1.27 22.86,1.27
3D body: height 7, standoff -1, extent 21.184,-0.406 21.98,0.392
3D body: height 1.5, standoff 0, extent 17.78,-1.27 20.32,1.27
3D body: height 7, standoff -1, extent 18.644,-0.406 19.44,0.392
3D body: height 1.5, standoff 0, extent 15.24,-1.27 17.78,1.27
3D body: height 7, standoff -1, extent 16.104,-0.406 16.9,0.392

## Jump 18 Cong [mm]
pads (18):
  rect 1.5x1.5 hole 0.9: 1(-21.59,0)
  round 1.5 hole 0.9: 2(-19.05,0) 3(-16.51,0) 4(-13.97,0) 5(-11.43,0) 6(-8.89,0) 7(-6.35,0) 8(-3.81,0) 9(-1.27,0) 10(1.27,0) 11(3.81,0) 12(6.35,0) 13(8.89,0) 14(11.43,0) 15(13.97,0) 16(16.51,0) 17(19.05,0) 18(21.59,0)
Top Overlay:
  lines w0.2: -22.013,-2.54 -22.013,-5.927 -21.59,-6.35 -21.167,-5.927 -21.167,-2.54 ; -19.473,-2.54 -19.473,-5.927 -19.05,-6.35 -18.627,-5.927 -18.627,-2.54 ; -16.933,-2.54 -16.933,-5.927 -16.51,-6.35 -16.087,-5.927 -16.087,-2.54 ; -14.393,-2.54 -14.393,-5.927 -13.97,-6.35 -13.547,-5.927 -13.547,-2.54 ; -11.853,-2.54 -11.853,-5.927 -11.43,-6.35 -11.007,-5.927 -11.007,-2.54 ; -9.313,-2.54 -9.313,-5.927 -8.89,-6.35 -8.467,-5.927 -8.467,-2.54 ; -6.773,-2.54 -6.773,-5.927 -6.35,-6.35 -5.927,-5.927 -5.927,-2.54 ; -4.233,-2.54 -4.233,-5.927 -3.81,-6.35 -3.387,-5.927 -3.387,-2.54 ; -1.693,-2.54 -1.693,-5.927 -1.27,-6.35 -0.847,-5.927 -0.847,-2.54 ; 0.847,-2.54 0.847,-5.927 1.27,-6.35 1.693,-5.927 1.693,-2.54 ; 3.387,-2.54 3.387,-5.927 3.81,-6.35 4.233,-5.927 4.233,-2.54 ; 5.927,-2.54 5.927,-5.927 6.35,-6.35 6.773,-5.927 6.773,-2.54 ; 8.467,-2.54 8.467,-5.927 8.89,-6.35 9.313,-5.927 9.313,-2.54 ; 11.007,-2.54 11.007,-5.927 11.43,-6.35 11.853,-5.927 11.853,-2.54 ; 13.547,-2.54 13.547,-5.927 13.97,-6.35 14.393,-5.927 14.393,-2.54 ; 16.087,-2.54 16.087,-5.927 16.51,-6.35 16.933,-5.927 16.933,-2.54 ; 18.627,-2.54 18.627,-5.927 19.05,-6.35 19.473,-5.927 19.473,-2.54 ; 21.167,-2.54 21.167,-5.927 21.59,-6.35 22.013,-5.927 22.013,-2.54 ; -22.86,-2.54 -22.86,-1.27 -20.955,-1.27 22.86,-1.27 22.86,-2.54 -22.86,-2.54
3D body: height 4.33, standoff -3, extent 17.78,-7 22.86,1.27
3D body: height 4.33, standoff -3, extent 12.7,-7 17.78,1.27
3D body: height 4.33, standoff -3, extent 7.62,-7 12.7,1.27
3D body: height 4.33, standoff -3, extent 2.54,-7 7.62,1.27
3D body: height 4.33, standoff -3, extent -2.54,-7 2.54,1.27
3D body: height 4.33, standoff -3, extent -7.62,-7 -2.54,1.27
3D body: height 4.33, standoff -3, extent -12.7,-7 -7.62,1.27
3D body: height 4.33, standoff -3, extent -17.78,-7 -12.7,1.27
3D body: height 4.33, standoff -3, extent -22.86,-7 -17.78,1.27